# Altium schematic symbol library jlcpcb_2025_04_capacitors_extended_0603.schlib: 3668 symbols (part 7 of 20) (continued)
## C1608C0G1H150JT000N
designator C?  Capacitance: 15pF  (hidden comment: *)
Capacitor, Ceramic (MLCC), 15pF, ±5%, 50V, C0G, ±5%, SMD 0603; Manufacturer: TDK; Manufacturer Part Number: C1608C0G1H150JT000N; Package Size: 0603; JLCPCB Basic Part: No; JLCPCB Part Number: C189802; Supplier 1: LCSC; Category: Capacitors - MLCC; Supplier Part Number 1: C189802; Tolerance: ±5%; Voltage Rating: 50V; Temperature Coefficient: C0G; RoHS: Yes; ComponentLink1Description: Datasheet; ComponentLink1URL: https://wmsc.lcsc.com/wmsc/upload/file/pdf/v2/lcsc/2304140030_TDK-C1608C0G1H150JT000N_C189802.pdf; ComponentLink2Description: JLCPCB Part URL; ComponentLink2URL: https://jlcpcb.com/partdetail/C189802; ComponentLink3Description: LCSC Part URL; ComponentLink3URL: https://lcsc.com/product-detail/Multilayer-Ceramic-Capacitors-MLCC---SMD-SMT_TDK-TDK-C1608C0G1H150JT000N_C189802.html
footprint CAP-0603 (0603 (1608M) Capacitor)
pins: 1, 2

## C1608C0G1H152JT000N
designator C?  Capacitance: 1.5nF  (hidden comment: *)
Capacitor, Ceramic (MLCC), 1.5nF, ±5%, 50V, C0G, ±5%, SMD 0603; Manufacturer: TDK; Manufacturer Part Number: C1608C0G1H152JT000N; Package Size: 0603; JLCPCB Basic Part: No; JLCPCB Part Number: C76600; Supplier 1: LCSC; Category: Capacitors - MLCC; Supplier Part Number 1: C76600; Tolerance: ±5%; Voltage Rating: 50V; Temperature Coefficient: C0G; RoHS: Yes; ComponentLink1Description: Datasheet; ComponentLink1URL: https://wmsc.lcsc.com/wmsc/upload/file/pdf/v2/lcsc/2304140030_TDK-C1608C0G1H152JT000N_C76600.pdf; ComponentLink2Description: JLCPCB Part URL; ComponentLink2URL: https://jlcpcb.com/partdetail/C76600; ComponentLink3Description: LCSC Part URL; ComponentLink3URL: https://lcsc.com/product-detail/Multilayer-Ceramic-Capacitors-MLCC---SMD-SMT_TDK-TDK-C1608C0G1H152JT000N_C76600.html
footprint CAP-0603 (0603 (1608M) Capacitor)
pins: 1, 2

## C1608C0G1H180JT000N
designator C?  Capacitance: 18pF  (hidden comment: *)
Capacitor, Ceramic (MLCC), 18pF, ±5%, 50V, C0G, ±5%, SMD 0603; Manufacturer: TDK; Manufacturer Part Number: C1608C0G1H180JT000N; Package Size: 0603; JLCPCB Basic Part: No; JLCPCB Part Number: C183113; Supplier 1: LCSC; Category: Capacitors - MLCC; Supplier Part Number 1: C183113; Tolerance: ±5%; Voltage Rating: 50V; Temperature Coefficient: C0G; RoHS: Yes; ComponentLink1Description: Datasheet; ComponentLink1URL: https://wmsc.lcsc.com/wmsc/upload/file/pdf/v2/lcsc/1811131654_TDK-C1608C0G1H180JT000N_C183113.pdf; ComponentLink2Description: JLCPCB Part URL; ComponentLink2URL: https://jlcpcb.com/partdetail/C183113; ComponentLink3Description: LCSC Part URL; ComponentLink3URL: https://lcsc.com/product-detail/Multilayer-Ceramic-Capacitors-MLCC---SMD-SMT_TDK-TDK-C1608C0G1H180JT000N_C183113.html
footprint CAP-0603 (0603 (1608M) Capacitor)
pins: 1, 2

## C1608C0G1H182JT000N
designator C?  Capacitance: 1.8nF  (hidden comment: *)
Capacitor, Ceramic (MLCC), 1.8nF, ±5%, 50V, C0G, ±5%, SMD 0603; Manufacturer: TDK; Manufacturer Part Number: C1608C0G1H182JT000N; Package Size: 0603; JLCPCB Basic Part: No; JLCPCB Part Number: C342567; Supplier 1: LCSC; Category: Capacitors - MLCC; Supplier Part Number 1: C342567; Tolerance: ±5%; Voltage Rating: 50V; Temperature Coefficient: C0G; RoHS: Yes; ComponentLink1Description: Datasheet; ComponentLink1URL: https://wmsc.lcsc.com/wmsc/upload/file/pdf/v2/lcsc/2304140030_TDK-C1608C0G1H182JT000N_C342567.pdf; ComponentLink2Description: JLCPCB Part URL; ComponentLink2URL: https://jlcpcb.com/partdetail/C342567; ComponentLink3Description: LCSC Part URL; ComponentLink3URL: https://lcsc.com/product-detail/Multilayer-Ceramic-Capacitors-MLCC---SMD-SMT_TDK-TDK-C1608C0G1H182JT000N_C342567.html
footprint CAP-0603 (0603 (1608M) Capacitor)
pins: 1, 2

## C1608C0G1H220JT000N
designator C?  Capacitance: 22pF  (hidden comment: *)
Capacitor, Ceramic (MLCC), 22pF, ±5%, 50V, C0G, ±5%, SMD 0603; Manufacturer: TDK; Manufacturer Part Number: C1608C0G1H220JT000N; Package Size: 0603; JLCPCB Basic Part: No; JLCPCB Part Number: C183114; Supplier 1: LCSC; Category: Capacitors - MLCC; Supplier Part Number 1: C183114; Tolerance: ±5%; Voltage Rating: 50V; Temperature Coefficient: C0G; RoHS: Yes; ComponentLink1Description: Datasheet; ComponentLink1URL: https://wmsc.lcsc.com/wmsc/upload/file/pdf/v2/lcsc/2304140030_TDK-C1608C0G1H220JT000N_C183114.pdf; ComponentLink2Description: JLCPCB Part URL; ComponentLink2URL: https://jlcpcb.com/partdetail/C183114; ComponentLink3Description: LCSC Part URL; ComponentLink3URL: https://lcsc.com/product-detail/Multilayer-Ceramic-Capacitors-MLCC---SMD-SMT_TDK-TDK-C1608C0G1H220JT000N_C183114.html
footprint CAP-0603 (0603 (1608M) Capacitor)
pins: 1, 2

## C1608C0G1H221JT000N
designator C?  Capacitance: 220pF  (hidden comment: *)
Capacitor, Ceramic (MLCC), 220pF, ±5%, 50V, C0G, ±5%, SMD 0603; Manufacturer: TDK; Manufacturer Part Number: C1608C0G1H221JT000N; Package Size: 0603; JLCPCB Basic Part: No; JLCPCB Part Number: C695131; Supplier 1: LCSC; Category: Capacitors - MLCC; Supplier Part Number 1: C695131; Tolerance: ±5%; Voltage Rating: 50V; Temperature Coefficient: C0G; RoHS: Yes; ComponentLink1Description: Datasheet; ComponentLink1URL: https://wmsc.lcsc.com/wmsc/upload/file/pdf/v2/lcsc/2304140030_TDK-C1608C0G1H221JT000N_C695131.pdf; ComponentLink2Description: JLCPCB Part URL; ComponentLink2URL: https://jlcpcb.com/partdetail/C695131; ComponentLink3Description: LCSC Part URL; ComponentLink3URL: https://lcsc.com/product-detail/Multilayer-Ceramic-Capacitors-MLCC---SMD-SMT_TDK-TDK-C1608C0G1H221JT000N_C695131.html
footprint CAP-0603 (0603 (1608M) Capacitor)
pins: 1, 2

## C1608C0G1H222JT000N
designator C?  Capacitance: 2.2nF  (hidden comment: *)
Capacitor, Ceramic (MLCC), 2.2nF, ±5%, 50V, C0G, ±5%, SMD 0603; Manufacturer: TDK; Manufacturer Part Number: C1608C0G1H222JT000N; Package Size: 0603; JLCPCB Basic Part: No; JLCPCB Part Number: C76601; Supplier 1: LCSC; Category: Capacitors - MLCC; Supplier Part Number 1: C76601; Tolerance: ±5%; Voltage Rating: 50V; Temperature Coefficient: C0G; RoHS: Yes; ComponentLink1Description: Datasheet; ComponentLink1URL: https://wmsc.lcsc.com/wmsc/upload/file/pdf/v2/lcsc/2304140030_TDK-C1608C0G1H222JT000N_C76601.pdf; ComponentLink2Description: JLCPCB Part URL; ComponentLink2URL: https://jlcpcb.com/partdetail/C76601; ComponentLink3Description: LCSC Part URL; ComponentLink3URL: https://lcsc.com/product-detail/Multilayer-Ceramic-Capacitors-MLCC---SMD-SMT_TDK-TDK-C1608C0G1H222JT000N_C76601.html
footprint CAP-0603 (0603 (1608M) Capacitor)
pins: 1, 2

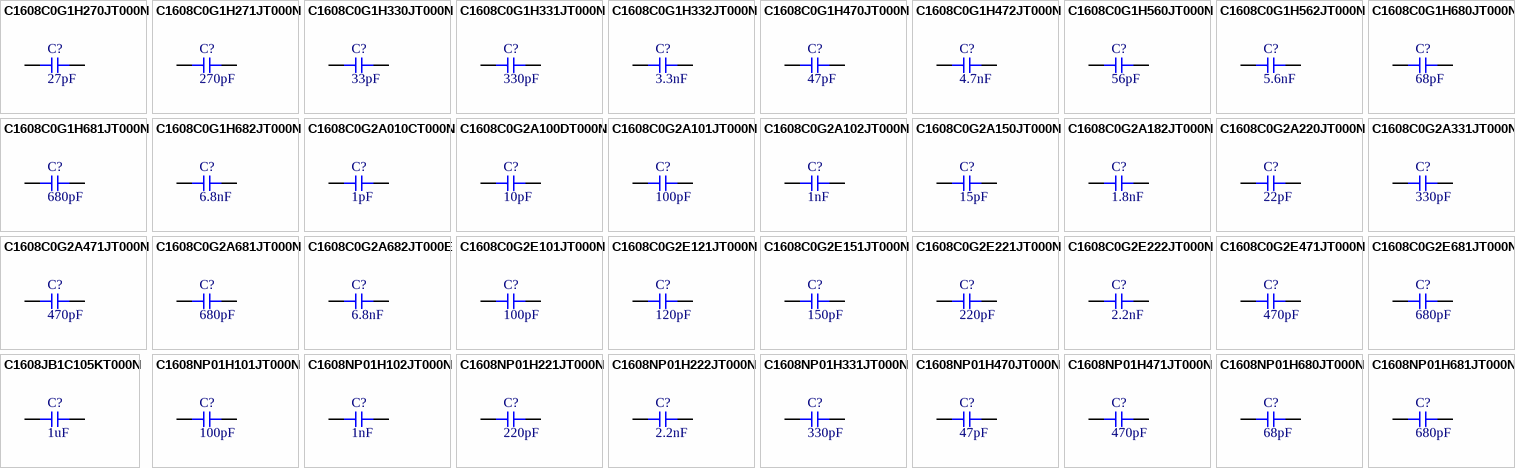
[diagram p30: symbols C1608C0G1H270JT000N to C1608NP01H681JT000N]

## C1608C0G1H270JT000N
designator C?  Capacitance: 27pF  (hidden comment: *)
Capacitor, Ceramic (MLCC), 27pF, ±5%, 50V, C0G, ±5%, SMD 0603; Manufacturer: TDK; Manufacturer Part Number: C1608C0G1H270JT000N; Package Size: 0603; JLCPCB Basic Part: No; JLCPCB Part Number: C361200; Supplier 1: LCSC; Category: Capacitors - MLCC; Supplier Part Number 1: C361200; Tolerance: ±5%; Voltage Rating: 50V; Temperature Coefficient: C0G; RoHS: Yes; ComponentLink1Description: Datasheet; ComponentLink1URL: https://wmsc.lcsc.com/wmsc/upload/file/pdf/v2/lcsc/2304140030_TDK-C1608C0G1H270JT000N_C361200.pdf; ComponentLink2Description: JLCPCB Part URL; ComponentLink2URL: https://jlcpcb.com/partdetail/C361200; ComponentLink3Description: LCSC Part URL; ComponentLink3URL: https://lcsc.com/product-detail/Multilayer-Ceramic-Capacitors-MLCC---SMD-SMT_TDK-TDK-C1608C0G1H270JT000N_C361200.html
footprint CAP-0603 (0603 (1608M) Capacitor)
pins: 1, 2

## C1608C0G1H271JT000N
designator C?  Capacitance: 270pF  (hidden comment: *)
Capacitor, Ceramic (MLCC), 270pF, ±5%, 50V, C0G, ±5%, SMD 0603; Manufacturer: TDK; Manufacturer Part Number: C1608C0G1H271JT000N; Package Size: 0603; JLCPCB Basic Part: No; JLCPCB Part Number: C695132; Supplier 1: LCSC; Category: Capacitors - MLCC; Supplier Part Number 1: C695132; Tolerance: ±5%; Voltage Rating: 50V; Temperature Coefficient: C0G; RoHS: Yes; ComponentLink1Description: Datasheet; ComponentLink1URL: https://wmsc.lcsc.com/wmsc/upload/file/pdf/v2/lcsc/2304140030_TDK-C1608C0G1H271JT000N_C695132.pdf; ComponentLink2Description: JLCPCB Part URL; ComponentLink2URL: https://jlcpcb.com/partdetail/C695132; ComponentLink3Description: LCSC Part URL; ComponentLink3URL: https://lcsc.com/product-detail/Multilayer-Ceramic-Capacitors-MLCC---SMD-SMT_TDK-TDK-C1608C0G1H271JT000N_C695132.html
footprint CAP-0603 (0603 (1608M) Capacitor)
pins: 1, 2

## C1608C0G1H330JT000N
designator C?  Capacitance: 33pF  (hidden comment: *)
Capacitor, Ceramic (MLCC), 33pF, ±5%, 50V, C0G, ±5%, SMD 0603; Manufacturer: TDK; Manufacturer Part Number: C1608C0G1H330JT000N; Package Size: 0603; JLCPCB Basic Part: No; JLCPCB Part Number: C338034; Supplier 1: LCSC; Category: Capacitors - MLCC; Supplier Part Number 1: C338034; Tolerance: ±5%; Voltage Rating: 50V; Temperature Coefficient: C0G; RoHS: Yes; ComponentLink1Description: Datasheet; ComponentLink1URL: https://wmsc.lcsc.com/wmsc/upload/file/pdf/v2/lcsc/2304140030_TDK-C1608C0G1H330JT000N_C338034.pdf; ComponentLink2Description: JLCPCB Part URL; ComponentLink2URL: https://jlcpcb.com/partdetail/C338034; ComponentLink3Description: LCSC Part URL; ComponentLink3URL: https://lcsc.com/product-detail/Multilayer-Ceramic-Capacitors-MLCC---SMD-SMT_TDK-TDK-C1608C0G1H330JT000N_C338034.html
footprint CAP-0603 (0603 (1608M) Capacitor)
pins: 1, 2

## C1608C0G1H331JT000N
designator C?  Capacitance: 330pF  (hidden comment: *)
Capacitor, Ceramic (MLCC), 330pF, ±5%, 50V, C0G, ±5%, SMD 0603; Manufacturer: TDK; Manufacturer Part Number: C1608C0G1H331JT000N; Package Size: 0603; JLCPCB Basic Part: No; JLCPCB Part Number: C695134; Supplier 1: LCSC; Category: Capacitors - MLCC; Supplier Part Number 1: C695134; Tolerance: ±5%; Voltage Rating: 50V; Temperature Coefficient: C0G; RoHS: Yes; ComponentLink1Description: Datasheet; ComponentLink1URL: https://wmsc.lcsc.com/wmsc/upload/file/pdf/v2/lcsc/2304140030_TDK-C1608C0G1H331JT000N_C695134.pdf; ComponentLink2Description: JLCPCB Part URL; ComponentLink2URL: https://jlcpcb.com/partdetail/C695134; ComponentLink3Description: LCSC Part URL; ComponentLink3URL: https://lcsc.com/product-detail/Multilayer-Ceramic-Capacitors-MLCC---SMD-SMT_TDK-TDK-C1608C0G1H331JT000N_C695134.html
footprint CAP-0603 (0603 (1608M) Capacitor)
pins: 1, 2

## C1608C0G1H332JT000N
designator C?  Capacitance: 3.3nF  (hidden comment: *)
Capacitor, Ceramic (MLCC), 3.3nF, ±5%, 50V, C0G, ±5%, SMD 0603; Manufacturer: TDK; Manufacturer Part Number: C1608C0G1H332JT000N; Package Size: 0603; JLCPCB Basic Part: No; JLCPCB Part Number: C342849; Supplier 1: LCSC; Category: Capacitors - MLCC; Supplier Part Number 1: C342849; Tolerance: ±5%; Voltage Rating: 50V; Temperature Coefficient: C0G; RoHS: Yes; ComponentLink1Description: Datasheet; ComponentLink1URL: https://wmsc.lcsc.com/wmsc/upload/file/pdf/v2/lcsc/2304140030_TDK-C1608C0G1H332JT000N_C342849.pdf; ComponentLink2Description: JLCPCB Part URL; ComponentLink2URL: https://jlcpcb.com/partdetail/C342849; ComponentLink3Description: LCSC Part URL; ComponentLink3URL: https://lcsc.com/product-detail/Multilayer-Ceramic-Capacitors-MLCC---SMD-SMT_TDK-TDK-C1608C0G1H332JT000N_C342849.html
footprint CAP-0603 (0603 (1608M) Capacitor)
pins: 1, 2

## C1608C0G1H470JT000N
designator C?  Capacitance: 47pF  (hidden comment: *)
Capacitor, Ceramic (MLCC), 47pF, ±5%, 50V, C0G, ±5%, SMD 0603; Manufacturer: TDK; Manufacturer Part Number: C1608C0G1H470JT000N; Package Size: 0603; JLCPCB Basic Part: No; JLCPCB Part Number: C445755; Supplier 1: LCSC; Category: Capacitors - MLCC; Supplier Part Number 1: C445755; Tolerance: ±5%; Voltage Rating: 50V; Temperature Coefficient: C0G; RoHS: Yes; ComponentLink1Description: Datasheet; ComponentLink1URL: https://wmsc.lcsc.com/wmsc/upload/file/pdf/v2/lcsc/2304140030_TDK-C1608C0G1H470JT000N_C445755.pdf; ComponentLink2Description: JLCPCB Part URL; ComponentLink2URL: https://jlcpcb.com/partdetail/C445755; ComponentLink3Description: LCSC Part URL; ComponentLink3URL: https://lcsc.com/product-detail/Multilayer-Ceramic-Capacitors-MLCC---SMD-SMT_TDK-TDK-C1608C0G1H470JT000N_C445755.html
footprint CAP-0603 (0603 (1608M) Capacitor)
pins: 1, 2

## C1608C0G1H472JT000N
designator C?  Capacitance: 4.7nF  (hidden comment: *)
Capacitor, Ceramic (MLCC), 4.7nF, ±5%, 50V, C0G, ±5%, SMD 0603; Manufacturer: TDK; Manufacturer Part Number: C1608C0G1H472JT000N; Package Size: 0603; JLCPCB Basic Part: No; JLCPCB Part Number: C342963; Supplier 1: LCSC; Category: Capacitors - MLCC; Supplier Part Number 1: C342963; Tolerance: ±5%; Voltage Rating: 50V; Temperature Coefficient: C0G; RoHS: Yes; ComponentLink1Description: Datasheet; ComponentLink1URL: https://wmsc.lcsc.com/wmsc/upload/file/pdf/v2/lcsc/2304140030_TDK-C1608C0G1H472JT000N_C342963.pdf; ComponentLink2Description: JLCPCB Part URL; ComponentLink2URL: https://jlcpcb.com/partdetail/C342963; ComponentLink3Description: LCSC Part URL; ComponentLink3URL: https://lcsc.com/product-detail/Multilayer-Ceramic-Capacitors-MLCC---SMD-SMT_TDK-TDK-C1608C0G1H472JT000N_C342963.html
footprint CAP-0603 (0603 (1608M) Capacitor)
pins: 1, 2

## C1608C0G1H560JT000N
designator C?  Capacitance: 56pF  (hidden comment: *)
Capacitor, Ceramic (MLCC), 56pF, ±5%, 50V, C0G, ±5%, SMD 0603; Manufacturer: TDK; Manufacturer Part Number: C1608C0G1H560JT000N; Package Size: 0603; JLCPCB Basic Part: No; JLCPCB Part Number: C694176; Supplier 1: LCSC; Category: Capacitors - MLCC; Supplier Part Number 1: C694176; Tolerance: ±5%; Voltage Rating: 50V; Temperature Coefficient: C0G; RoHS: Yes; ComponentLink1Description: Datasheet; ComponentLink1URL: https://wmsc.lcsc.com/wmsc/upload/file/pdf/v2/lcsc/2304140030_TDK-C1608C0G1H560JT000N_C694176.pdf; ComponentLink2Description: JLCPCB Part URL; ComponentLink2URL: https://jlcpcb.com/partdetail/C694176; ComponentLink3Description: LCSC Part URL; ComponentLink3URL: https://lcsc.com/product-detail/Multilayer-Ceramic-Capacitors-MLCC---SMD-SMT_TDK-TDK-C1608C0G1H560JT000N_C694176.html
footprint CAP-0603 (0603 (1608M) Capacitor)
pins: 1, 2

## C1608C0G1H562JT000N
designator C?  Capacitance: 5.6nF  (hidden comment: *)
Capacitor, Ceramic (MLCC), 5.6nF, ±5%, 50V, C0G, ±5%, SMD 0603; Manufacturer: TDK; Manufacturer Part Number: C1608C0G1H562JT000N; Package Size: 0603; JLCPCB Basic Part: No; JLCPCB Part Number: C342850; Supplier 1: LCSC; Category: Capacitors - MLCC; Supplier Part Number 1: C342850; Tolerance: ±5%; Voltage Rating: 50V; Temperature Coefficient: C0G; RoHS: Yes; ComponentLink1Description: Datasheet; ComponentLink1URL: https://wmsc.lcsc.com/wmsc/upload/file/pdf/v2/lcsc/2304140030_TDK-C1608C0G1H562JT000N_C342850.pdf; ComponentLink2Description: JLCPCB Part URL; ComponentLink2URL: https://jlcpcb.com/partdetail/C342850; ComponentLink3Description: LCSC Part URL; ComponentLink3URL: https://lcsc.com/product-detail/Multilayer-Ceramic-Capacitors-MLCC---SMD-SMT_TDK-TDK-C1608C0G1H562JT000N_C342850.html
footprint CAP-0603 (0603 (1608M) Capacitor)
pins: 1, 2

## C1608C0G1H680JT000N
designator C?  Capacitance: 68pF  (hidden comment: *)
Capacitor, Ceramic (MLCC), 68pF, ±5%, 50V, C0G, ±5%, SMD 0603; Manufacturer: TDK; Manufacturer Part Number: C1608C0G1H680JT000N; Package Size: 0603; JLCPCB Basic Part: No; JLCPCB Part Number: C191990; Supplier 1: LCSC; Category: Capacitors - MLCC; Supplier Part Number 1: C191990; Tolerance: ±5%; Voltage Rating: 50V; Temperature Coefficient: C0G; RoHS: Yes; ComponentLink1Description: Datasheet; ComponentLink1URL: https://wmsc.lcsc.com/wmsc/upload/file/pdf/v2/lcsc/1811131654_TDK-C1608C0G1H680JT000N_C191990.pdf; ComponentLink2Description: JLCPCB Part URL; ComponentLink2URL: https://jlcpcb.com/partdetail/C191990; ComponentLink3Description: LCSC Part URL; ComponentLink3URL: https://lcsc.com/product-detail/Multilayer-Ceramic-Capacitors-MLCC---SMD-SMT_TDK-TDK-C1608C0G1H680JT000N_C191990.html
footprint CAP-0603 (0603 (1608M) Capacitor)
pins: 1, 2

## C1608C0G1H681JT000N
designator C?  Capacitance: 680pF  (hidden comment: *)
Capacitor, Ceramic (MLCC), 680pF, ±5%, 50V, C0G, ±5%, SMD 0603; Manufacturer: TDK; Manufacturer Part Number: C1608C0G1H681JT000N; Package Size: 0603; JLCPCB Basic Part: No; JLCPCB Part Number: C694278; Supplier 1: LCSC; Category: Capacitors - MLCC; Supplier Part Number 1: C694278; Tolerance: ±5%; Voltage Rating: 50V; Temperature Coefficient: C0G; RoHS: Yes; ComponentLink1Description: Datasheet; ComponentLink1URL: https://wmsc.lcsc.com/wmsc/upload/file/pdf/v2/lcsc/2304140030_TDK-C1608C0G1H681JT000N_C694278.pdf; ComponentLink2Description: JLCPCB Part URL; ComponentLink2URL: https://jlcpcb.com/partdetail/C694278; ComponentLink3Description: LCSC Part URL; ComponentLink3URL: https://lcsc.com/product-detail/Multilayer-Ceramic-Capacitors-MLCC---SMD-SMT_TDK-TDK-C1608C0G1H681JT000N_C694278.html
footprint CAP-0603 (0603 (1608M) Capacitor)
pins: 1, 2

## C1608C0G1H682JT000N
designator C?  Capacitance: 6.8nF  (hidden comment: *)
Capacitor, Ceramic (MLCC), 6.8nF, ±5%, 50V, C0G, ±5%, SMD 0603; Manufacturer: TDK; Manufacturer Part Number: C1608C0G1H682JT000N; Package Size: 0603; JLCPCB Basic Part: No; JLCPCB Part Number: C342851; Supplier 1: LCSC; Category: Capacitors - MLCC; Supplier Part Number 1: C342851; Tolerance: ±5%; Voltage Rating: 50V; Temperature Coefficient: C0G; RoHS: Yes; ComponentLink1Description: Datasheet; ComponentLink1URL: https://wmsc.lcsc.com/wmsc/upload/file/pdf/v2/lcsc/2304140030_TDK-C1608C0G1H682JT000N_C342851.pdf; ComponentLink2Description: JLCPCB Part URL; ComponentLink2URL: https://jlcpcb.com/partdetail/C342851; ComponentLink3Description: LCSC Part URL; ComponentLink3URL: https://lcsc.com/product-detail/Multilayer-Ceramic-Capacitors-MLCC---SMD-SMT_TDK-TDK-C1608C0G1H682JT000N_C342851.html
footprint CAP-0603 (0603 (1608M) Capacitor)
pins: 1, 2

## C1608C0G2A010CT000N
designator C?  Capacitance: 1pF  (hidden comment: *)
Capacitor, Ceramic (MLCC), 1pF, 100V, C0G, SMD 0603; Manufacturer: TDK; Manufacturer Part Number: C1608C0G2A010CT000N; Package Size: 0603; JLCPCB Basic Part: No; JLCPCB Part Number: C342535; Supplier 1: LCSC; Category: Capacitors - MLCC; Supplier Part Number 1: C342535; Voltage Rating: 100V; Temperature Coefficient: C0G; RoHS: Yes; ComponentLink1Description: Datasheet; ComponentLink1URL: https://wmsc.lcsc.com/wmsc/upload/file/pdf/v2/lcsc/2304140030_TDK-C1608C0G2A010CT000N_C342535.pdf; ComponentLink2Description: JLCPCB Part URL; ComponentLink2URL: https://jlcpcb.com/partdetail/C342535; ComponentLink3Description: LCSC Part URL; ComponentLink3URL: https://lcsc.com/product-detail/Multilayer-Ceramic-Capacitors-MLCC---SMD-SMT_TDK-TDK-C1608C0G2A010CT000N_C342535.html
footprint CAP-0603 (0603 (1608M) Capacitor)
pins: 1, 2

## C1608C0G2A100DT000N
designator C?  Capacitance: 10pF  (hidden comment: *)
Capacitor, Ceramic (MLCC), 10pF, 100V, C0G, SMD 0603; Manufacturer: TDK; Manufacturer Part Number: C1608C0G2A100DT000N; Package Size: 0603; JLCPCB Basic Part: No; JLCPCB Part Number: C342531; Supplier 1: LCSC; Category: Capacitors - MLCC; Supplier Part Number 1: C342531; Voltage Rating: 100V; Temperature Coefficient: C0G; RoHS: Yes; ComponentLink1Description: Datasheet; ComponentLink1URL: https://wmsc.lcsc.com/wmsc/upload/file/pdf/v2/lcsc/2304140030_TDK-C1608C0G2A100DT000N_C342531.pdf; ComponentLink2Description: JLCPCB Part URL; ComponentLink2URL: https://jlcpcb.com/partdetail/C342531; ComponentLink3Description: LCSC Part URL; ComponentLink3URL: https://lcsc.com/product-detail/Multilayer-Ceramic-Capacitors-MLCC---SMD-SMT_TDK-TDK-C1608C0G2A100DT000N_C342531.html
footprint CAP-0603 (0603 (1608M) Capacitor)
pins: 1, 2

## C1608C0G2A101JT000N
designator C?  Capacitance: 100pF  (hidden comment: *)
Capacitor, Ceramic (MLCC), 100pF, ±5%, 100V, C0G, ±5%, SMD 0603; Manufacturer: TDK; Manufacturer Part Number: C1608C0G2A101JT000N; Package Size: 0603; JLCPCB Basic Part: No; JLCPCB Part Number: C342536; Supplier 1: LCSC; Category: Capacitors - MLCC; Supplier Part Number 1: C342536; Tolerance: ±5%; Voltage Rating: 100V; Temperature Coefficient: C0G; RoHS: Yes; ComponentLink1Description: Datasheet; ComponentLink1URL: https://wmsc.lcsc.com/wmsc/upload/file/pdf/v2/lcsc/2304140030_TDK-C1608C0G2A101JT000N_C342536.pdf; ComponentLink2Description: JLCPCB Part URL; ComponentLink2URL: https://jlcpcb.com/partdetail/C342536; ComponentLink3Description: LCSC Part URL; ComponentLink3URL: https://lcsc.com/product-detail/Multilayer-Ceramic-Capacitors-MLCC---SMD-SMT_TDK-TDK-C1608C0G2A101JT000N_C342536.html
footprint CAP-0603 (0603 (1608M) Capacitor)
pins: 1, 2

## C1608C0G2A102JT000N
designator C?  Capacitance: 1nF  (hidden comment: *)
Capacitor, Ceramic (MLCC), 1nF, ±5%, 100V, C0G, ±5%, SMD 0603; Manufacturer: TDK; Manufacturer Part Number: C1608C0G2A102JT000N; Package Size: 0603; JLCPCB Basic Part: No; JLCPCB Part Number: C342578; Supplier 1: LCSC; Category: Capacitors - MLCC; Supplier Part Number 1: C342578; Tolerance: ±5%; Voltage Rating: 100V; Temperature Coefficient: C0G; RoHS: Yes; ComponentLink1Description: Datasheet; ComponentLink1URL: https://wmsc.lcsc.com/wmsc/upload/file/pdf/v2/lcsc/2304140030_TDK-C1608C0G2A102JT000N_C342578.pdf; ComponentLink2Description: JLCPCB Part URL; ComponentLink2URL: https://jlcpcb.com/partdetail/C342578; ComponentLink3Description: LCSC Part URL; ComponentLink3URL: https://lcsc.com/product-detail/Multilayer-Ceramic-Capacitors-MLCC---SMD-SMT_TDK-TDK-C1608C0G2A102JT000N_C342578.html
footprint CAP-0603 (0603 (1608M) Capacitor)
pins: 1, 2

## C1608C0G2A150JT000N
designator C?  Capacitance: 15pF  (hidden comment: *)
Capacitor, Ceramic (MLCC), 15pF, ±5%, 100V, C0G, ±5%, SMD 0603; Manufacturer: TDK; Manufacturer Part Number: C1608C0G2A150JT000N; Package Size: 0603; JLCPCB Basic Part: No; JLCPCB Part Number: C342548; Supplier 1: LCSC; Category: Capacitors - MLCC; Supplier Part Number 1: C342548; Tolerance: ±5%; Voltage Rating: 100V; Temperature Coefficient: C0G; RoHS: Yes; ComponentLink1Description: Datasheet; ComponentLink1URL: https://wmsc.lcsc.com/wmsc/upload/file/pdf/v2/lcsc/2304140030_TDK-C1608C0G2A150JT000N_C342548.pdf; ComponentLink2Description: JLCPCB Part URL; ComponentLink2URL: https://jlcpcb.com/partdetail/C342548; ComponentLink3Description: LCSC Part URL; ComponentLink3URL: https://lcsc.com/product-detail/Multilayer-Ceramic-Capacitors-MLCC---SMD-SMT_TDK-TDK-C1608C0G2A150JT000N_C342548.html
footprint CAP-0603 (0603 (1608M) Capacitor)
pins: 1, 2

## C1608C0G2A182JT000N
designator C?  Capacitance: 1.8nF  (hidden comment: *)
Capacitor, Ceramic (MLCC), 1.8nF, ±5%, 100V, C0G, ±5%, SMD 0603; Manufacturer: TDK; Manufacturer Part Number: C1608C0G2A182JT000N; Package Size: 0603; JLCPCB Basic Part: No; JLCPCB Part Number: C343008; Supplier 1: LCSC; Category: Capacitors - MLCC; Supplier Part Number 1: C343008; Tolerance: ±5%; Voltage Rating: 100V; Temperature Coefficient: C0G; RoHS: Yes; ComponentLink1Description: Datasheet; ComponentLink1URL: https://wmsc.lcsc.com/wmsc/upload/file/pdf/v2/lcsc/2304140030_TDK-C1608C0G2A182JT000N_C343008.pdf; ComponentLink2Description: JLCPCB Part URL; ComponentLink2URL: https://jlcpcb.com/partdetail/C343008; ComponentLink3Description: LCSC Part URL; ComponentLink3URL: https://lcsc.com/product-detail/Multilayer-Ceramic-Capacitors-MLCC---SMD-SMT_TDK-TDK-C1608C0G2A182JT000N_C343008.html
footprint CAP-0603 (0603 (1608M) Capacitor)
pins: 1, 2

## C1608C0G2A220JT000N
designator C?  Capacitance: 22pF  (hidden comment: *)
Capacitor, Ceramic (MLCC), 22pF, ±5%, 100V, C0G, ±5%, SMD 0603; Manufacturer: TDK; Manufacturer Part Number: C1608C0G2A220JT000N; Package Size: 0603; JLCPCB Basic Part: No; JLCPCB Part Number: C342563; Supplier 1: LCSC; Category: Capacitors - MLCC; Supplier Part Number 1: C342563; Tolerance: ±5%; Voltage Rating: 100V; Temperature Coefficient: C0G; RoHS: Yes; ComponentLink1Description: Datasheet; ComponentLink1URL: https://wmsc.lcsc.com/wmsc/upload/file/pdf/v2/lcsc/2304140030_TDK-C1608C0G2A220JT000N_C342563.pdf; ComponentLink2Description: JLCPCB Part URL; ComponentLink2URL: https://jlcpcb.com/partdetail/C342563; ComponentLink3Description: LCSC Part URL; ComponentLink3URL: https://lcsc.com/product-detail/Multilayer-Ceramic-Capacitors-MLCC---SMD-SMT_TDK-TDK-C1608C0G2A220JT000N_C342563.html
footprint CAP-0603 (0603 (1608M) Capacitor)
pins: 1, 2

## C1608C0G2A331JT000N
designator C?  Capacitance: 330pF  (hidden comment: *)
Capacitor, Ceramic (MLCC), 330pF, ±5%, 100V, C0G, ±5%, SMD 0603; Manufacturer: TDK; Manufacturer Part Number: C1608C0G2A331JT000N; Package Size: 0603; JLCPCB Basic Part: No; JLCPCB Part Number: C342568; Supplier 1: LCSC; Category: Capacitors - MLCC; Supplier Part Number 1: C342568; Tolerance: ±5%; Voltage Rating: 100V; Temperature Coefficient: C0G; RoHS: Yes; ComponentLink1Description: Datasheet; ComponentLink1URL: https://wmsc.lcsc.com/wmsc/upload/file/pdf/v2/lcsc/2304140030_TDK-C1608C0G2A331JT000N_C342568.pdf; ComponentLink2Description: JLCPCB Part URL; ComponentLink2URL: https://jlcpcb.com/partdetail/C342568; ComponentLink3Description: LCSC Part URL; ComponentLink3URL: https://lcsc.com/product-detail/Multilayer-Ceramic-Capacitors-MLCC---SMD-SMT_TDK-TDK-C1608C0G2A331JT000N_C342568.html
footprint CAP-0603 (0603 (1608M) Capacitor)
pins: 1, 2

## C1608C0G2A471JT000N
designator C?  Capacitance: 470pF  (hidden comment: *)
Capacitor, Ceramic (MLCC), 470pF, ±5%, 100V, C0G, ±5%, SMD 0603; Manufacturer: TDK; Manufacturer Part Number: C1608C0G2A471JT000N; Package Size: 0603; JLCPCB Basic Part: No; JLCPCB Part Number: C342574; Supplier 1: LCSC; Category: Capacitors - MLCC; Supplier Part Number 1: C342574; Tolerance: ±5%; Voltage Rating: 100V; Temperature Coefficient: C0G; RoHS: Yes; ComponentLink1Description: Datasheet; ComponentLink1URL: https://wmsc.lcsc.com/wmsc/upload/file/pdf/v2/lcsc/2304140030_TDK-C1608C0G2A471JT000N_C342574.pdf; ComponentLink2Description: JLCPCB Part URL; ComponentLink2URL: https://jlcpcb.com/partdetail/C342574; ComponentLink3Description: LCSC Part URL; ComponentLink3URL: https://lcsc.com/product-detail/Multilayer-Ceramic-Capacitors-MLCC---SMD-SMT_TDK-TDK-C1608C0G2A471JT000N_C342574.html
footprint CAP-0603 (0603 (1608M) Capacitor)
pins: 1, 2

## C1608C0G2A681JT000N
designator C?  Capacitance: 680pF  (hidden comment: *)
Capacitor, Ceramic (MLCC), 680pF, ±5%, 100V, C0G, ±5%, SMD 0603; Manufacturer: TDK; Manufacturer Part Number: C1608C0G2A681JT000N; Package Size: 0603; JLCPCB Basic Part: No; JLCPCB Part Number: C342580; Supplier 1: LCSC; Category: Capacitors - MLCC; Supplier Part Number 1: C342580; Tolerance: ±5%; Voltage Rating: 100V; Temperature Coefficient: C0G; RoHS: Yes; ComponentLink1Description: Datasheet; ComponentLink1URL: https://wmsc.lcsc.com/wmsc/upload/file/pdf/v2/lcsc/2304140030_TDK-C1608C0G2A681JT000N_C342580.pdf; ComponentLink2Description: JLCPCB Part URL; ComponentLink2URL: https://jlcpcb.com/partdetail/C342580; ComponentLink3Description: LCSC Part URL; ComponentLink3URL: https://lcsc.com/product-detail/Multilayer-Ceramic-Capacitors-MLCC---SMD-SMT_TDK-TDK-C1608C0G2A681JT000N_C342580.html
footprint CAP-0603 (0603 (1608M) Capacitor)
pins: 1, 2

## C1608C0G2A682JT000E
designator C?  Capacitance: 6.8nF  (hidden comment: *)
Capacitor, Ceramic (MLCC), 6.8nF, ±5%, 100V, C0G, ±5%, SMD 0603; Manufacturer: TDK; Manufacturer Part Number: C1608C0G2A682JT000E; Package Size: 0603; JLCPCB Basic Part: No; JLCPCB Part Number: C2939039; Supplier 1: LCSC; Category: Capacitors - MLCC; Supplier Part Number 1: C2939039; Tolerance: ±5%; Voltage Rating: 100V; Temperature Coefficient: C0G; RoHS: Yes; ComponentLink1Description: Datasheet; ComponentLink1URL: https://wmsc.lcsc.com/wmsc/upload/file/pdf/v2/lcsc/2201121830_TDK-C1608C0G2A682JT000E_C2939039.pdf; ComponentLink2Description: JLCPCB Part URL; ComponentLink2URL: https://jlcpcb.com/partdetail/C2939039; ComponentLink3Description: LCSC Part URL; ComponentLink3URL: https://lcsc.com/product-detail/Multilayer-Ceramic-Capacitors-MLCC---SMD-SMT_TDK-TDK-C1608C0G2A682JT000E_C2939039.html
footprint CAP-0603 (0603 (1608M) Capacitor)
pins: 1, 2

## C1608C0G2E101JT000N
designator C?  Capacitance: 100pF  (hidden comment: *)
Capacitor, Ceramic (MLCC), 100pF, ±5%, 250V, C0G, ±5%, SMD 0603; Manufacturer: TDK; Manufacturer Part Number: C1608C0G2E101JT000N; Package Size: 0603; JLCPCB Basic Part: No; JLCPCB Part Number: C76606; Supplier 1: LCSC; Category: Capacitors - MLCC; Supplier Part Number 1: C76606; Tolerance: ±5%; Voltage Rating: 250V; Temperature Coefficient: C0G; RoHS: Yes; ComponentLink1Description: Datasheet; ComponentLink1URL: https://wmsc.lcsc.com/wmsc/upload/file/pdf/v2/lcsc/2304140030_TDK-C1608C0G2E101JT000N_C76606.pdf; ComponentLink2Description: JLCPCB Part URL; ComponentLink2URL: https://jlcpcb.com/partdetail/C76606; ComponentLink3Description: LCSC Part URL; ComponentLink3URL: https://lcsc.com/product-detail/Multilayer-Ceramic-Capacitors-MLCC---SMD-SMT_TDK-TDK-C1608C0G2E101JT000N_C76606.html
footprint CAP-0603 (0603 (1608M) Capacitor)
pins: 1, 2

## C1608C0G2E121JT000N
designator C?  Capacitance: 120pF  (hidden comment: *)
Capacitor, Ceramic (MLCC), 120pF, ±5%, 250V, C0G, ±5%, SMD 0603; Manufacturer: TDK; Manufacturer Part Number: C1608C0G2E121JT000N; Package Size: 0603; JLCPCB Basic Part: No; JLCPCB Part Number: C508853; Supplier 1: LCSC; Category: Capacitors - MLCC; Supplier Part Number 1: C508853; Tolerance: ±5%; Voltage Rating: 250V; Temperature Coefficient: C0G; RoHS: Yes; ComponentLink1Description: Datasheet; ComponentLink1URL: https://wmsc.lcsc.com/wmsc/upload/file/pdf/v2/lcsc/2304140030_TDK-C1608C0G2E121JT000N_C508853.pdf; ComponentLink2Description: JLCPCB Part URL; ComponentLink2URL: https://jlcpcb.com/partdetail/C508853; ComponentLink3Description: LCSC Part URL; ComponentLink3URL: https://lcsc.com/product-detail/Multilayer-Ceramic-Capacitors-MLCC---SMD-SMT_TDK-TDK-C1608C0G2E121JT000N_C508853.html
footprint CAP-0603 (0603 (1608M) Capacitor)
pins: 1, 2

## C1608C0G2E151JT000N
designator C?  Capacitance: 150pF  (hidden comment: *)
Capacitor, Ceramic (MLCC), 150pF, ±5%, 250V, C0G, ±5%, SMD 0603; Manufacturer: TDK; Manufacturer Part Number: C1608C0G2E151JT000N; Package Size: 0603; JLCPCB Basic Part: No; JLCPCB Part Number: C342573; Supplier 1: LCSC; Category: Capacitors - MLCC; Supplier Part Number 1: C342573; Tolerance: ±5%; Voltage Rating: 250V; Temperature Coefficient: C0G; RoHS: Yes; ComponentLink1Description: Datasheet; ComponentLink1URL: https://wmsc.lcsc.com/wmsc/upload/file/pdf/v2/lcsc/2304140030_TDK-C1608C0G2E151JT000N_C342573.pdf; ComponentLink2Description: JLCPCB Part URL; ComponentLink2URL: https://jlcpcb.com/partdetail/C342573; ComponentLink3Description: LCSC Part URL; ComponentLink3URL: https://lcsc.com/product-detail/Multilayer-Ceramic-Capacitors-MLCC---SMD-SMT_TDK-TDK-C1608C0G2E151JT000N_C342573.html
footprint CAP-0603 (0603 (1608M) Capacitor)
pins: 1, 2

## C1608C0G2E221JT000N
designator C?  Capacitance: 220pF  (hidden comment: *)
Capacitor, Ceramic (MLCC), 220pF, ±5%, 250V, C0G, ±5%, SMD 0603; Manufacturer: TDK; Manufacturer Part Number: C1608C0G2E221JT000N; Package Size: 0603; JLCPCB Basic Part: No; JLCPCB Part Number: C342566; Supplier 1: LCSC; Category: Capacitors - MLCC; Supplier Part Number 1: C342566; Tolerance: ±5%; Voltage Rating: 250V; Temperature Coefficient: C0G; RoHS: Yes; ComponentLink1Description: Datasheet; ComponentLink1URL: https://wmsc.lcsc.com/wmsc/upload/file/pdf/v2/lcsc/2304140030_TDK-C1608C0G2E221JT000N_C342566.pdf; ComponentLink2Description: JLCPCB Part URL; ComponentLink2URL: https://jlcpcb.com/partdetail/C342566; ComponentLink3Description: LCSC Part URL; ComponentLink3URL: https://lcsc.com/product-detail/Multilayer-Ceramic-Capacitors-MLCC---SMD-SMT_TDK-TDK-C1608C0G2E221JT000N_C342566.html
footprint CAP-0603 (0603 (1608M) Capacitor)
pins: 1, 2

## C1608C0G2E222JT000N
designator C?  Capacitance: 2.2nF  (hidden comment: *)
Capacitor, Ceramic (MLCC), 2.2nF, ±5%, 250V, C0G, ±5%, SMD 0603; Manufacturer: TDK; Manufacturer Part Number: C1608C0G2E222JT000N; Package Size: 0603; JLCPCB Basic Part: No; JLCPCB Part Number: C694281; Supplier 1: LCSC; Category: Capacitors - MLCC; Supplier Part Number 1: C694281; Tolerance: ±5%; Voltage Rating: 250V; Temperature Coefficient: C0G; RoHS: Yes; ComponentLink1Description: Datasheet; ComponentLink1URL: https://wmsc.lcsc.com/wmsc/upload/file/pdf/v2/lcsc/2304140030_TDK-C1608C0G2E222JT000N_C694281.pdf; ComponentLink2Description: JLCPCB Part URL; ComponentLink2URL: https://jlcpcb.com/partdetail/C694281; ComponentLink3Description: LCSC Part URL; ComponentLink3URL: https://lcsc.com/product-detail/Multilayer-Ceramic-Capacitors-MLCC---SMD-SMT_TDK-TDK-C1608C0G2E222JT000N_C694281.html
footprint CAP-0603 (0603 (1608M) Capacitor)
pins: 1, 2

## C1608C0G2E471JT000N
designator C?  Capacitance: 470pF  (hidden comment: *)
Capacitor, Ceramic (MLCC), 470pF, ±5%, 250V, C0G, ±5%, SMD 0603; Manufacturer: TDK; Manufacturer Part Number: C1608C0G2E471JT000N; Package Size: 0603; JLCPCB Basic Part: No; JLCPCB Part Number: C342576; Supplier 1: LCSC; Category: Capacitors - MLCC; Supplier Part Number 1: C342576; Tolerance: ±5%; Voltage Rating: 250V; Temperature Coefficient: C0G; RoHS: Yes; ComponentLink1Description: Datasheet; ComponentLink1URL: https://wmsc.lcsc.com/wmsc/upload/file/pdf/v2/lcsc/2304140030_TDK-C1608C0G2E471JT000N_C342576.pdf; ComponentLink2Description: JLCPCB Part URL; ComponentLink2URL: https://jlcpcb.com/partdetail/C342576; ComponentLink3Description: LCSC Part URL; ComponentLink3URL: https://lcsc.com/product-detail/Multilayer-Ceramic-Capacitors-MLCC---SMD-SMT_TDK-TDK-C1608C0G2E471JT000N_C342576.html
footprint CAP-0603 (0603 (1608M) Capacitor)
pins: 1, 2

## C1608C0G2E681JT000N
designator C?  Capacitance: 680pF  (hidden comment: *)
Capacitor, Ceramic (MLCC), 680pF, ±5%, 250V, C0G, ±5%, SMD 0603; Manufacturer: TDK; Manufacturer Part Number: C1608C0G2E681JT000N; Package Size: 0603; JLCPCB Basic Part: No; JLCPCB Part Number: C694283; Supplier 1: LCSC; Category: Capacitors - MLCC; Supplier Part Number 1: C694283; Tolerance: ±5%; Voltage Rating: 250V; Temperature Coefficient: C0G; RoHS: Yes; ComponentLink1Description: Datasheet; ComponentLink1URL: https://wmsc.lcsc.com/wmsc/upload/file/pdf/v2/lcsc/2304140030_TDK-C1608C0G2E681JT000N_C694283.pdf; ComponentLink2Description: JLCPCB Part URL; ComponentLink2URL: https://jlcpcb.com/partdetail/C694283; ComponentLink3Description: LCSC Part URL; ComponentLink3URL: https://lcsc.com/product-detail/Multilayer-Ceramic-Capacitors-MLCC---SMD-SMT_TDK-TDK-C1608C0G2E681JT000N_C694283.html
footprint CAP-0603 (0603 (1608M) Capacitor)
pins: 1, 2

## C1608JB1C105KT000N
designator C?  Capacitance: 1uF  (hidden comment: *)
Capacitor, Ceramic (MLCC), 1uF, ±10%, 16V, ±10%, SMD 0603; Manufacturer: TDK; Manufacturer Part Number: C1608JB1C105KT000N; Package Size: 0603; JLCPCB Basic Part: No; JLCPCB Part Number: C694284; Supplier 1: LCSC; Category: Capacitors - MLCC; Supplier Part Number 1: C694284; Tolerance: ±10%; Voltage Rating: 16V; RoHS: Yes; ComponentLink1Description: Datasheet; ComponentLink1URL: https://wmsc.lcsc.com/wmsc/upload/file/pdf/v2/lcsc/2304140030_TDK-C1608JB1C105KT000N_C694284.pdf; ComponentLink2Description: JLCPCB Part URL; ComponentLink2URL: https://jlcpcb.com/partdetail/C694284; ComponentLink3Description: LCSC Part URL; ComponentLink3URL: https://lcsc.com/product-detail/Multilayer-Ceramic-Capacitors-MLCC---SMD-SMT_TDK-TDK-C1608JB1C105KT000N_C694284.html
footprint CAP-0603 (0603 (1608M) Capacitor)
pins: 1, 2

## C1608NP01H101JT000N
designator C?  Capacitance: 100pF  (hidden comment: *)
Capacitor, Ceramic (MLCC), 100pF, ±5%, 50V, NP0, ±5%, SMD 0603; Manufacturer: TDK; Manufacturer Part Number: C1608NP01H101JT000N; Package Size: 0603; JLCPCB Basic Part: No; JLCPCB Part Number: C343033; Supplier 1: LCSC; Category: Capacitors - MLCC; Supplier Part Number 1: C343033; Tolerance: ±5%; Voltage Rating: 50V; Temperature Coefficient: NP0; RoHS: Yes; ComponentLink1Description: Datasheet; ComponentLink1URL: https://wmsc.lcsc.com/wmsc/upload/file/pdf/v2/lcsc/2304140030_TDK-C1608NP01H101JT000N_C343033.pdf; ComponentLink2Description: JLCPCB Part URL; ComponentLink2URL: https://jlcpcb.com/partdetail/C343033; ComponentLink3Description: LCSC Part URL; ComponentLink3URL: https://lcsc.com/product-detail/Multilayer-Ceramic-Capacitors-MLCC---SMD-SMT_TDK-TDK-C1608NP01H101JT000N_C343033.html
footprint CAP-0603 (0603 (1608M) Capacitor)
pins: 1, 2

## C1608NP01H102JT000N
designator C?  Capacitance: 1nF  (hidden comment: *)
Capacitor, Ceramic (MLCC), 1nF, ±5%, 50V, NP0, ±5%, SMD 0603; Manufacturer: TDK; Manufacturer Part Number: C1608NP01H102JT000N; Package Size: 0603; JLCPCB Basic Part: No; JLCPCB Part Number: C342972; Supplier 1: LCSC; Category: Capacitors - MLCC; Supplier Part Number 1: C342972; Tolerance: ±5%; Voltage Rating: 50V; Temperature Coefficient: NP0; RoHS: Yes; ComponentLink1Description: Datasheet; ComponentLink1URL: https://wmsc.lcsc.com/wmsc/upload/file/pdf/v2/lcsc/2304140030_TDK-C1608NP01H102JT000N_C342972.pdf; ComponentLink2Description: JLCPCB Part URL; ComponentLink2URL: https://jlcpcb.com/partdetail/C342972; ComponentLink3Description: LCSC Part URL; ComponentLink3URL: https://lcsc.com/product-detail/Multilayer-Ceramic-Capacitors-MLCC---SMD-SMT_TDK-TDK-C1608NP01H102JT000N_C342972.html
footprint CAP-0603 (0603 (1608M) Capacitor)
pins: 1, 2

## C1608NP01H221JT000N
designator C?  Capacitance: 220pF  (hidden comment: *)
Capacitor, Ceramic (MLCC), 220pF, ±5%, 50V, NP0, ±5%, SMD 0603; Manufacturer: TDK; Manufacturer Part Number: C1608NP01H221JT000N; Package Size: 0603; JLCPCB Basic Part: No; JLCPCB Part Number: C343009; Supplier 1: LCSC; Category: Capacitors - MLCC; Supplier Part Number 1: C343009; Tolerance: ±5%; Voltage Rating: 50V; Temperature Coefficient: NP0; RoHS: Yes; ComponentLink1Description: Datasheet; ComponentLink1URL: https://wmsc.lcsc.com/wmsc/upload/file/pdf/v2/lcsc/2304140030_TDK-C1608NP01H221JT000N_C343009.pdf; ComponentLink2Description: JLCPCB Part URL; ComponentLink2URL: https://jlcpcb.com/partdetail/C343009; ComponentLink3Description: LCSC Part URL; ComponentLink3URL: https://lcsc.com/product-detail/Multilayer-Ceramic-Capacitors-MLCC---SMD-SMT_TDK-TDK-C1608NP01H221JT000N_C343009.html
footprint CAP-0603 (0603 (1608M) Capacitor)
pins: 1, 2

## C1608NP01H222JT000N
designator C?  Capacitance: 2.2nF  (hidden comment: *)
Capacitor, Ceramic (MLCC), 2.2nF, ±5%, 50V, NP0, ±5%, SMD 0603; Manufacturer: TDK; Manufacturer Part Number: C1608NP01H222JT000N; Package Size: 0603; JLCPCB Basic Part: No; JLCPCB Part Number: C342876; Supplier 1: LCSC; Category: Capacitors - MLCC; Supplier Part Number 1: C342876; Tolerance: ±5%; Voltage Rating: 50V; Temperature Coefficient: NP0; RoHS: Yes; ComponentLink1Description: Datasheet; ComponentLink1URL: https://wmsc.lcsc.com/wmsc/upload/file/pdf/v2/lcsc/2304140030_TDK-C1608NP01H222JT000N_C342876.pdf; ComponentLink2Description: JLCPCB Part URL; ComponentLink2URL: https://jlcpcb.com/partdetail/C342876; ComponentLink3Description: LCSC Part URL; ComponentLink3URL: https://lcsc.com/product-detail/Multilayer-Ceramic-Capacitors-MLCC---SMD-SMT_TDK-TDK-C1608NP01H222JT000N_C342876.html
footprint CAP-0603 (0603 (1608M) Capacitor)
pins: 1, 2

## C1608NP01H331JT000N
designator C?  Capacitance: 330pF  (hidden comment: *)
Capacitor, Ceramic (MLCC), 330pF, ±5%, 50V, NP0, ±5%, SMD 0603; Manufacturer: TDK; Manufacturer Part Number: C1608NP01H331JT000N; Package Size: 0603; JLCPCB Basic Part: No; JLCPCB Part Number: C343002; Supplier 1: LCSC; Category: Capacitors - MLCC; Supplier Part Number 1: C343002; Tolerance: ±5%; Voltage Rating: 50V; Temperature Coefficient: NP0; RoHS: Yes; ComponentLink1Description: Datasheet; ComponentLink1URL: https://wmsc.lcsc.com/wmsc/upload/file/pdf/v2/lcsc/2304140030_TDK-C1608NP01H331JT000N_C343002.pdf; ComponentLink2Description: JLCPCB Part URL; ComponentLink2URL: https://jlcpcb.com/partdetail/C343002; ComponentLink3Description: LCSC Part URL; ComponentLink3URL: https://lcsc.com/product-detail/Multilayer-Ceramic-Capacitors-MLCC---SMD-SMT_TDK-TDK-C1608NP01H331JT000N_C343002.html
footprint CAP-0603 (0603 (1608M) Capacitor)
pins: 1, 2

## C1608NP01H470JT000N
designator C?  Capacitance: 47pF  (hidden comment: *)
Capacitor, Ceramic (MLCC), 47pF, ±5%, 50V, NP0, ±5%, SMD 0603; Manufacturer: TDK; Manufacturer Part Number: C1608NP01H470JT000N; Package Size: 0603; JLCPCB Basic Part: No; JLCPCB Part Number: C343034; Supplier 1: LCSC; Category: Capacitors - MLCC; Supplier Part Number 1: C343034; Tolerance: ±5%; Voltage Rating: 50V; Temperature Coefficient: NP0; RoHS: Yes; ComponentLink1Description: Datasheet; ComponentLink1URL: https://wmsc.lcsc.com/wmsc/upload/file/pdf/v2/lcsc/2304140030_TDK-C1608NP01H470JT000N_C343034.pdf; ComponentLink2Description: JLCPCB Part URL; ComponentLink2URL: https://jlcpcb.com/partdetail/C343034; ComponentLink3Description: LCSC Part URL; ComponentLink3URL: https://lcsc.com/product-detail/Multilayer-Ceramic-Capacitors-MLCC---SMD-SMT_TDK-TDK-C1608NP01H470JT000N_C343034.html
footprint CAP-0603 (0603 (1608M) Capacitor)
pins: 1, 2

## C1608NP01H471JT000N
designator C?  Capacitance: 470pF  (hidden comment: *)
Capacitor, Ceramic (MLCC), 470pF, ±5%, 50V, NP0, ±5%, SMD 0603; Manufacturer: TDK; Manufacturer Part Number: C1608NP01H471JT000N; Package Size: 0603; JLCPCB Basic Part: No; JLCPCB Part Number: C343003; Supplier 1: LCSC; Category: Capacitors - MLCC; Supplier Part Number 1: C343003; Tolerance: ±5%; Voltage Rating: 50V; Temperature Coefficient: NP0; RoHS: Yes; ComponentLink1Description: Datasheet; ComponentLink1URL: https://wmsc.lcsc.com/wmsc/upload/file/pdf/v2/lcsc/2304140030_TDK-C1608NP01H471JT000N_C343003.pdf; ComponentLink2Description: JLCPCB Part URL; ComponentLink2URL: https://jlcpcb.com/partdetail/C343003; ComponentLink3Description: LCSC Part URL; ComponentLink3URL: https://lcsc.com/product-detail/Multilayer-Ceramic-Capacitors-MLCC---SMD-SMT_TDK-TDK-C1608NP01H471JT000N_C343003.html
footprint CAP-0603 (0603 (1608M) Capacitor)
pins: 1, 2

## C1608NP01H680JT000N
designator C?  Capacitance: 68pF  (hidden comment: *)
Capacitor, Ceramic (MLCC), 68pF, ±5%, 50V, NP0, ±5%, SMD 0603; Manufacturer: TDK; Manufacturer Part Number: C1608NP01H680JT000N; Package Size: 0603; JLCPCB Basic Part: No; JLCPCB Part Number: C343035; Supplier 1: LCSC; Category: Capacitors - MLCC; Supplier Part Number 1: C343035; Tolerance: ±5%; Voltage Rating: 50V; Temperature Coefficient: NP0; RoHS: Yes; ComponentLink1Description: Datasheet; ComponentLink1URL: https://wmsc.lcsc.com/wmsc/upload/file/pdf/v2/lcsc/2304140030_TDK-C1608NP01H680JT000N_C343035.pdf; ComponentLink2Description: JLCPCB Part URL; ComponentLink2URL: https://jlcpcb.com/partdetail/C343035; ComponentLink3Description: LCSC Part URL; ComponentLink3URL: https://lcsc.com/product-detail/Multilayer-Ceramic-Capacitors-MLCC---SMD-SMT_TDK-TDK-C1608NP01H680JT000N_C343035.html
footprint CAP-0603 (0603 (1608M) Capacitor)
pins: 1, 2

## C1608NP01H681JT000N
designator C?  Capacitance: 680pF  (hidden comment: *)
Capacitor, Ceramic (MLCC), 680pF, ±5%, 50V, NP0, ±5%, SMD 0603; Manufacturer: TDK; Manufacturer Part Number: C1608NP01H681JT000N; Package Size: 0603; JLCPCB Basic Part: No; JLCPCB Part Number: C342994; Supplier 1: LCSC; Category: Capacitors - MLCC; Supplier Part Number 1: C342994; Tolerance: ±5%; Voltage Rating: 50V; Temperature Coefficient: NP0; RoHS: Yes; ComponentLink1Description: Datasheet; ComponentLink1URL: https://wmsc.lcsc.com/wmsc/upload/file/pdf/v2/lcsc/2304140030_TDK-C1608NP01H681JT000N_C342994.pdf; ComponentLink2Description: JLCPCB Part URL; ComponentLink2URL: https://jlcpcb.com/partdetail/C342994; ComponentLink3Description: LCSC Part URL; ComponentLink3URL: https://lcsc.com/product-detail/Multilayer-Ceramic-Capacitors-MLCC---SMD-SMT_TDK-TDK-C1608NP01H681JT000N_C342994.html
footprint CAP-0603 (0603 (1608M) Capacitor)
pins: 1, 2

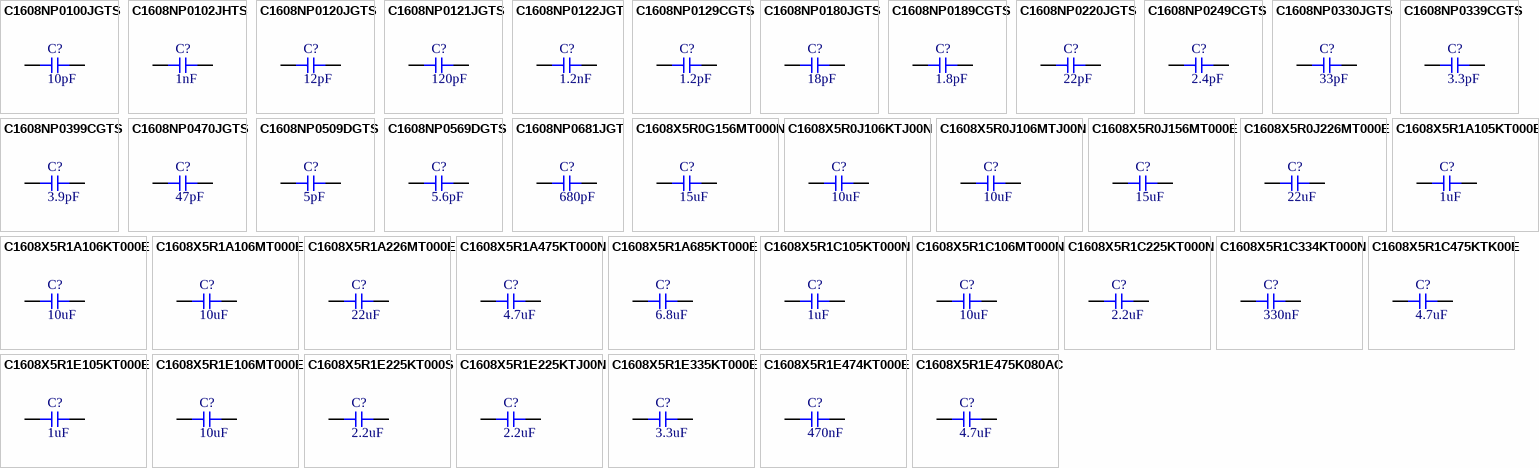
[diagram p31: symbols C1608NP0100JGTS to C1608X5R1E475K080AC]
